# Altium footprint library LUMI_Handy_Soldering_LIB.PcbLib: 562 footprints (part 29 of 36)
Each footprint in its own frame and in the unit in brackets; x right, y up, seen from the top. Pads: shape width x height; smd on the part's side, far side on the other; paste and mask are expansions set on the pad; w line width, h text height; cw(c..) or ccw(c..) is an arc to the next point about the centre after c.
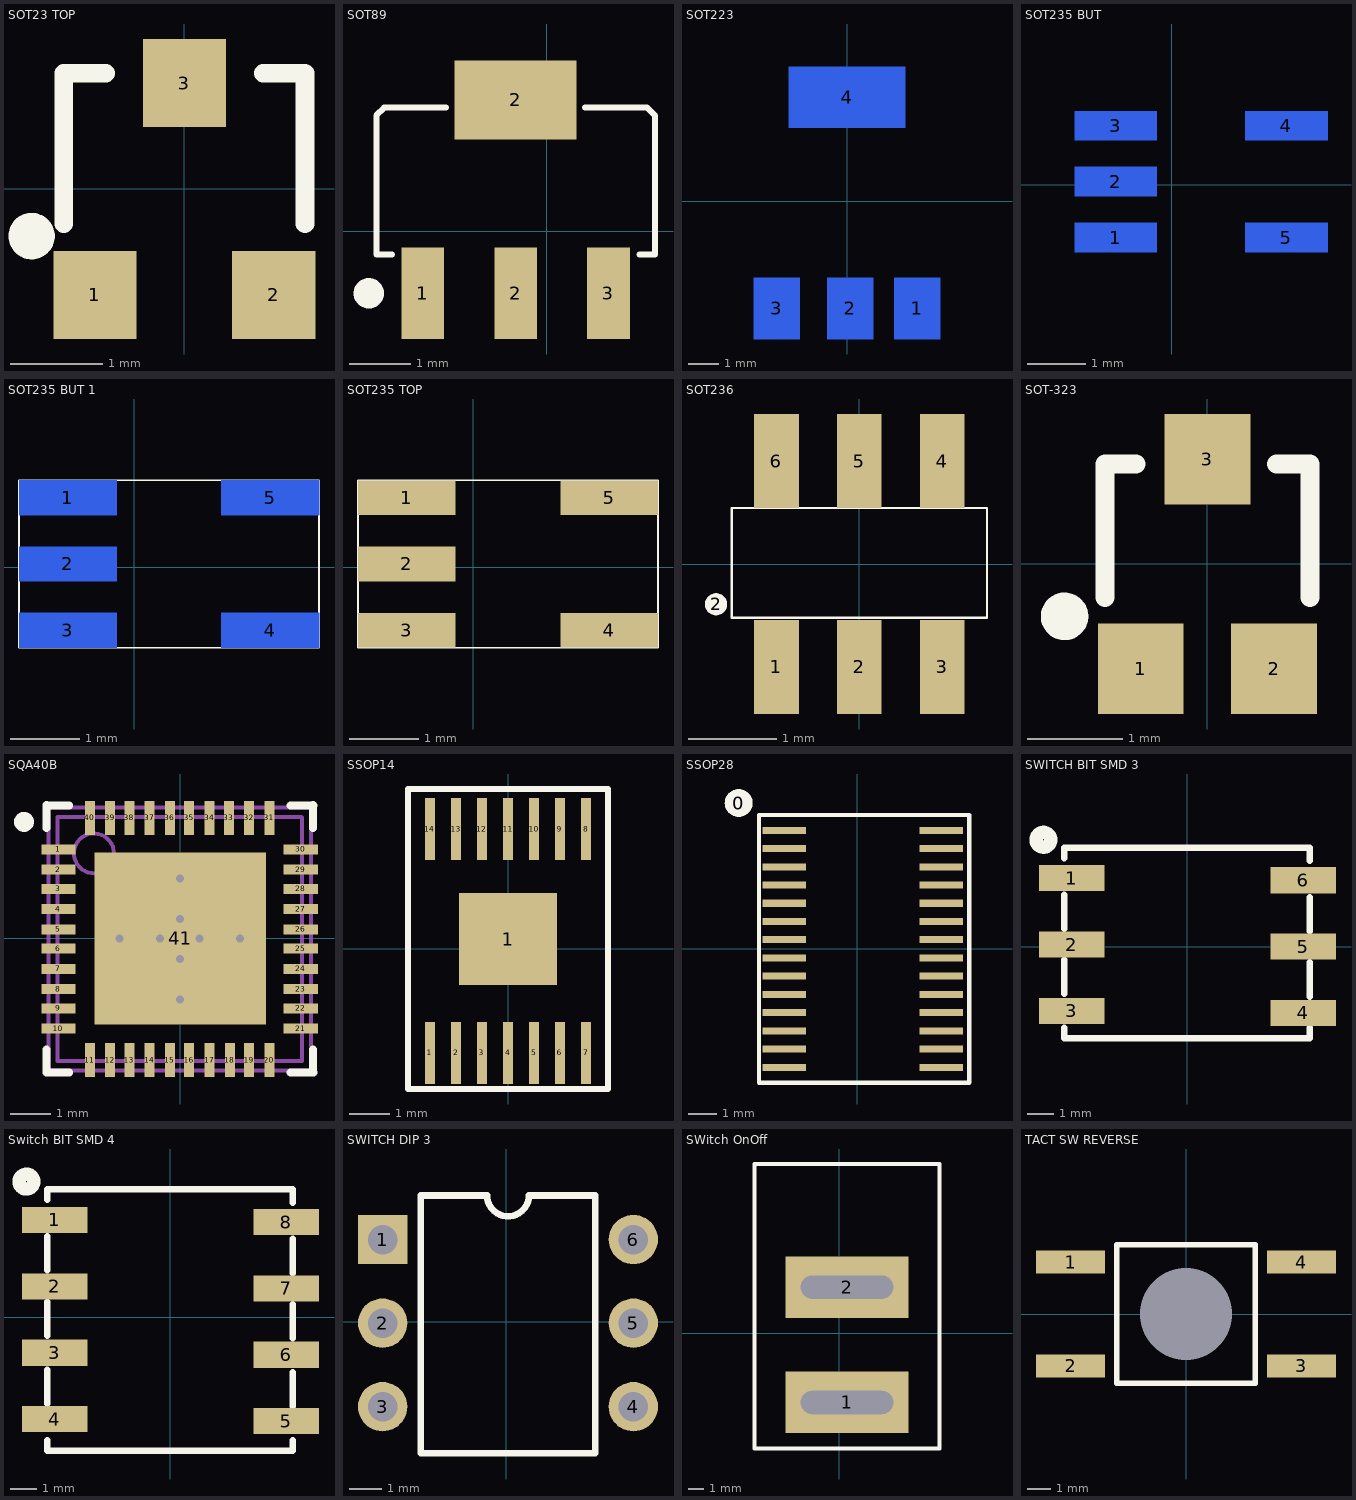
[diagram p28: the footprints below, top view; thin cyan lines are the x and y axes]

## SOT23 TOP [mm]
pads (3):
  rect 0.9x0.95 smd: 1(-0.965,-1.143) 2(0.965,-1.143) 3(0,1.143)
Top Overlay:
  circle w0.25: c-1.649,-0.508 r0.125
  lines w0.2: -1.3,-0.375 -1.3,1.25 -0.85,1.25 ; 0.85,1.25 1.3,1.25 1.3,-0.375
3D body: height 1, standoff 0, extent -1.46,-1.17 1.46,1.17

## SOT89 [mm]
pads (4):
  rect 0.7x1.5 smd: 1(-2.032,-1.016) 2(-0.508,-1.016) 3(1.016,-1.016)
  rect 2x1.3 smd: 2(-0.508,2.159)
Top Overlay:
  circle w0.25: c-2.919,-1.016 r0.125
  lines w0.1: -2.54,-0.381 -2.794,-0.381 -2.794,1.905 -2.667,2.032 -1.651,2.032 ; 0.635,2.032 1.651,2.032 1.778,1.905 1.778,-0.381 1.524,-0.381
3D body: height 1.4, standoff 0, extent -2.758,-1.423 1.742,2.512

## SOT223 [mm]
pads (4):
  rect 1.5x2 smd far side: 1(2.3,-3.5) 2(0.1,-3.5) 3(-2.3,-3.5)
  rect 3.8x2 smd far side: 4(0,3.4)
Bottom Overlay:
  lines w0.254: -3.3,-2.5 -3.3,2.4 3.3,2.4 3.3,-2.5 -3.3,-2.5
3D body: height 1.74, standoff 0.06, extent -3.25,-3.48 3.25,3.48

## SOT235 BUT [mm]
pads (6):
  rect 1.4x0.5 smd far side: 1(-0.95,-0.9) 2(-0.95,0.05) 3(-0.95,1) 4(1.95,1) 5(1.95,-0.9)
  round 0.5 on Bottom Overlay: ""(-2.057,-1.6)
Bottom Overlay:
  lines w0.1: -1.803,-1.473 -1.803,1.575 2.794,1.575 2.794,-1.499 2.769,-1.473 -1.803,-1.473
3D body: height -0.38, standoff -1.68, extent -1,-1.45 2,1.55

## SOT235 BUT 1 [mm]
pads (5):
  rect 1.4x0.5 smd far side: 1(-0.95,1) 2(-0.95,0.05) 3(-0.95,-0.9) 4(1.95,-0.9) 5(1.95,1)
Top Overlay:
  lines w0.025: -1.65,-1.15 -1.65,1.25 2.65,1.25 2.65,-1.15 -1.65,-1.15
3D body: height -0.38, standoff -1.68, extent -1,-1.45 2,1.55

## SOT235 TOP [mm]
pads (5):
  rect 1.4x0.5 smd: 1(-0.95,1) 2(-0.95,0.05) 3(-0.95,-0.9) 4(1.95,-0.9) 5(1.95,1)
Top Overlay:
  lines w0.025: -1.65,-1.15 -1.65,1.25 2.65,1.25 2.65,-1.15 -1.65,-1.15
3D body: height 1.3, standoff 0, extent -1,-1.45 2,1.55

## SOT236 [mil]
pads (7):
  rect 20x42 smd: 1(-37,-46) 2(0,-46) 3(37,-46) 4(37,46) 5(0,46) 6(-37,46)
  round 10 on Top Overlay: 2(-64,-18)
Top Overlay:
  lines w1: -57,-24 -57,25 57,25 57,-24 -57,-24
3D body: height 39.37, standoff 0, extent -57.48,-46.06 57.48,46.07

## SOT-323 [mm]
pads (3):
  rect 0.9x0.95 smd: 1(-0.7,-1.1) 2(0.7,-1.1) 3(0,1.1)
Top Overlay:
  circle w0.25: c-1.5,-0.55 r0.125
  lines w0.2: -1.075,-0.35 -1.075,1.05 -0.75,1.05 ; 0.725,1.05 1.075,1.05 1.075,-0.35
3D body: height 0.9, standoff 0, extent -1,-1.042 1.1,1.058

## SQA40B [mil] "QFN, 40-Leads, Body 6x6mm, Pitch 0.5mm, NSC Recommended"
height 31.5
pads (41):
  rect 33.62x9.84 smd paste-4.92 mask+2: 1(-120,88) 2(-120,68) 3(-120,49) 4(-120,29) 5(-120,9) 6(-120,-10) 7(-120,-30) 8(-120,-50) 9(-120,-69) 10(-120,-89) 21(119,-89) 22(119,-69) 23(119,-50) 24(119,-30) 25(119,-10) 26(119,9) 27(119,29) 28(119,49) 29(119,68) 30(119,88)
  rect 9.84x33.62 smd paste-4.92 mask+2: 11(-89,-120) 12(-69,-120) 13(-50,-120) 14(-30,-120) 15(-10,-120) 16(9,-120) 17(29,-120) 18(49,-120) 19(68,-120) 20(88,-120) 31(88,119) 32(68,119) 33(48,119) 34(29,119) 35(9,119) 36(-10,119) 37(-30,119) 38(-50,119) 39(-69,119) 40(-89,119)
  rect 169.29x169.29 smd paste-84.65 mask+2: 41(0,0)
via 0,19 diameter 19.68 hole 7.87
via 0,-20 diameter 19.68 hole 7.87
via 19,0 diameter 19.68 hole 7.87
via -20,0 diameter 19.68 hole 7.87
via 59,0 diameter 19.68 hole 7.87
via 0,59 diameter 19.68 hole 7.87
via 0,-60 diameter 19.68 hole 7.87
via -60,0 diameter 19.68 hole 7.87
Top Overlay:
  circle w9.84: c-154,115 r4.92
  lines w7.87: -132,-109.36 -132,-132 -109.36,-132 ; -132,109 -132,131.64 ; -132,131 -109.36,131 ; 109,-132 131.64,-132 ; 109,131 131.64,131 ; 131,-132 131,-109.36 ; 131,109 131,131.64
Top Paste:
  rectangle: 3,-79 77.8,-4.2
  region: -4,-4 -78.8,-4 -78.8,-78.8 -4,-78.8
  region: -4,78 -78.8,78 -78.8,3.2 -4,3.2
  rectangle: 3,3 77.8,77.8
  region: 83,137 83,101 92.84,101 92.84,137
  region: 63,137 63,102 72.84,102 72.84,137
  region: 44,137 44,101 53.84,101 53.84,137
  region: 24,137 24,101 33.84,101 33.84,137
  region: 4,137 4,101 13.84,101 13.84,137
  region: -15,137 -15,101 -5.16,101 -5.16,137
  region: -35,137 -35,101 -25.16,101 -25.16,137
  region: -55,137 -55,105.44 -45.16,105.44 -45.16,137
  region: -74,137 -74,101 -64.16,101 -64.16,137
  region: -94,137 -94,101 -84.16,101 -84.16,137
  region: 137,-84 101,-84 101,-93.84 137,-93.84
  region: 137,-64 101,-64 101,-73.84 137,-73.84
  region: 137,-45 101,-45 101,-54.84 137,-54.84
  region: 137,-25 101,-25 101,-34.84 137,-34.84
  region: 137,-5 101,-5 101,-14.84 137,-14.84
  region: 137,14 101,14 101,4.16 137,4.16
  region: 137,34 101,34 101,24.16 137,24.16
  region: 137,54 101,54 101,44.16 137,44.16
  region: 137,73 101,73 101,63.16 137,63.16
  region: 137,93 101,93 101,83.16 137,83.16
  region: -84.16,-138 -84.16,-102 -94,-102 -94,-138
  region: -64.16,-138 -64.16,-102 -74,-102 -74,-138
  region: -45,-138 -45,-102 -54.84,-102 -54.84,-138
  region: -25,-138 -25,-102 -34.84,-102 -34.84,-138
  region: -5,-138 -5,-103 -14.84,-103 -14.84,-138
  region: 14,-138 14,-103 4.16,-103 4.16,-138
  region: 34,-138 34,-103 24.16,-103 24.16,-138
  region: 54,-138 54,-103 44.16,-103 44.16,-138
  region: 73,-138 73,-103 63.16,-103 63.16,-138
  region: 93,-138 93,-103 83.16,-103 83.16,-138
  rectangle: -138,-94 -102,-84.16
  rectangle: -138,-74 -102,-64.16
  rectangle: -138,-55 -102,-45.16
  rectangle: -138,-35 -102,-25.16
  rectangle: -138,-15 -102,-5.16
  rectangle: -138,4 -102,13.84
  rectangle: -138,24 -102,33.84
  rectangle: -138,44 -102,53.84
  rectangle: -138,63 -102,72.84
  rectangle: -138,83 -103,92.84
Mechanical 13:
  circle w3.94: c-85,84 r19.68
  lines w3.94: -121,119.16 -121,-121 119.16,-121 ; -121,120 119.16,120 ; 120,-121 120,119.16
Mechanical 15:
  lines w3.94: -130,129 129.84,129 ; -130,129.84 -130,-130 129.84,-130 ; -20,0 19.37,0 ; 0,-20 0,19.37 ; 129,-130 129,129.84
3D body: height 31.5, standoff 0, extent -121,-121 119.16,119.16

## SSOP14 [mm]
pads (15):
  rect 0.25x1.55 smd: 1(-1.95,-2.6) 2(-1.3,-2.6) 3(-0.65,-2.6) 4(0,-2.6) 5(0.65,-2.6) 6(1.3,-2.6) 7(1.95,-2.6) 8(1.95,3) 9(1.3,3) 10(0.65,3) 11(0,3) 12(-0.65,3) 13(-1.3,3) 14(-1.95,3)
  rect 2.46x2.31 smd: 1(0,0.25)
Top Overlay:
  lines w0.152: -2.5,-3.5 -2.5,4 2.5,4 2.5,-3.5 -2.5,-3.5
3D body: height 1.73, standoff -0.08, extent -2.5,-2.75 2.5,3.25

## SSOP28 [mm]
pads (29):
  round 1 on Top Overlay: 0(-4.225,5.2)
  rect 1.55x0.25 smd: 1(-2.6,4.225) 2(-2.6,3.575) 3(-2.6,2.925) 4(-2.6,2.275) 5(-2.6,1.625) 6(-2.6,0.975) 7(-2.6,0.325) 8(-2.6,-0.325) 9(-2.6,-0.975) 10(-2.6,-1.625) 11(-2.6,-2.275) 12(-2.6,-2.925) 13(-2.6,-3.575) 14(-2.6,-4.225) 15(3,-4.225) 16(3,-3.575) 17(3,-2.925) 18(3,-2.275) 19(3,-1.625) 20(3,-0.975) 21(3,-0.325) 22(3,0.325) 23(3,0.975) 24(3,1.625) 25(3,2.275) 26(3,2.925) 27(3,3.575) 28(3,4.225)
Top Overlay:
  lines w0.152: -3.5,-0.225 -3.5,4.775 4,4.775 4,-0.225 ; -3.5,0.225 -3.5,-4.775 4,-4.775 4,0.225
3D body: height 1.75, standoff 0, extent -3.094,-4.991 3.094,4.991

## SWITCH BIT SMD 3 [mm]
pads (6):
  rect 2.5x1 smd: 1(-4.42,2.63) 2(-4.42,0.09) 3(-4.42,-2.45) 4(4.45,-2.53) 5(4.45,0.01) 6(4.45,2.55)
Top Overlay:
  circle w0.508: c-5.5,4.1 r0.283
  lines w0.254: -4.7,-3.1 -4.7,-3.5 4.7,-3.5 4.7,-3.1 ; -4.7,-1.8 -4.7,-0.5 ; -4.7,0.7 -4.7,2 ; -4.7,3.4 -4.7,3.8 4.7,3.8 4.7,3.3 ; 4.7,-1.9 4.7,-0.6 ; 4.7,0.6 4.7,1.9

## Switch BIT SMD 4 [mm]
pads (8):
  rect 2.5x1 smd: 1(-4.42,3.73) 2(-4.42,1.19) 3(-4.42,-1.35) 4(-4.42,-3.89) 5(4.45,-3.97) 6(4.45,-1.43) 7(4.45,1.11) 8(4.45,3.65)
Top Overlay:
  circle w0.508: c-5.5,5.2 r0.283
  lines w0.254: -4.7,-4.7 -4.7,-5.1 4.7,-5.1 4.7,-4.7 ; -4.7,-3.3 -4.7,-2 ; -4.7,-0.7 -4.7,0.6 ; -4.7,1.8 -4.7,3.1 ; -4.7,4.5 -4.7,4.9 4.7,4.9 4.7,4.4 ; 4.7,-3.4 4.7,-2.1 ; 4.7,-0.8 4.7,0.5 ; 4.7,1.7 4.7,3
3D body: height 2.93, standoff 0.02, extent -4.65,-5.105 4.65,4.905

## SWITCH DIP 3 [mm]
pads (6):
  rect 1.5x1.5 hole 0.9: 1(-3.75,2.5)
  round 1.5 hole 0.9: 2(-3.75,-0.04) 3(-3.75,-2.58) 4(3.87,-2.58) 5(3.87,-0.04) 6(3.87,2.5)
Top Overlay:
  lines w0.2: -2.59,-4 2.71,-4 2.71,3.84 0.695,3.84 cw(c0.06,3.84) -0.575,3.84 -2.59,3.84 -2.59,-4
3D body: height 6.9, standoff -3.2, extent -5.08,-4.6 5.08,4.54

## SWitch OnOff [mm] "Cong tac dong ngat"
pads (2):
  rect 8x4 hole 1.5 slot 6 at 0 deg: 1(0.5,-4.5) 2(0.5,3)
Top Overlay:
  lines w0.254: -5.5,-7.5 -5.5,11 6.5,11 6.5,-7.5 -5.5,-7.5

## TACT SW REVERSE [mm]
pads (5):
  rect 3x1 smd: 1(-5,2.25) 2(-5,-2.25) 3(5,-2.25) 4(5,2.25)
  round 0 hole 4: ""(0,0)
Top Overlay:
  lines w0.254: -3,-3 -3,3 3,3 3,-3 -3,-3